# Altium footprint library ALL.PcbLib: 153 footprints (part 1 of 11)
Each footprint in its own frame and in the unit in brackets; x right, y up, seen from the top. Pads: shape width x height; smd on the part's side, far side on the other; paste and mask are expansions set on the pad; w line width, h text height; cw(c..) or ccw(c..) is an arc to the next point about the centre after c.
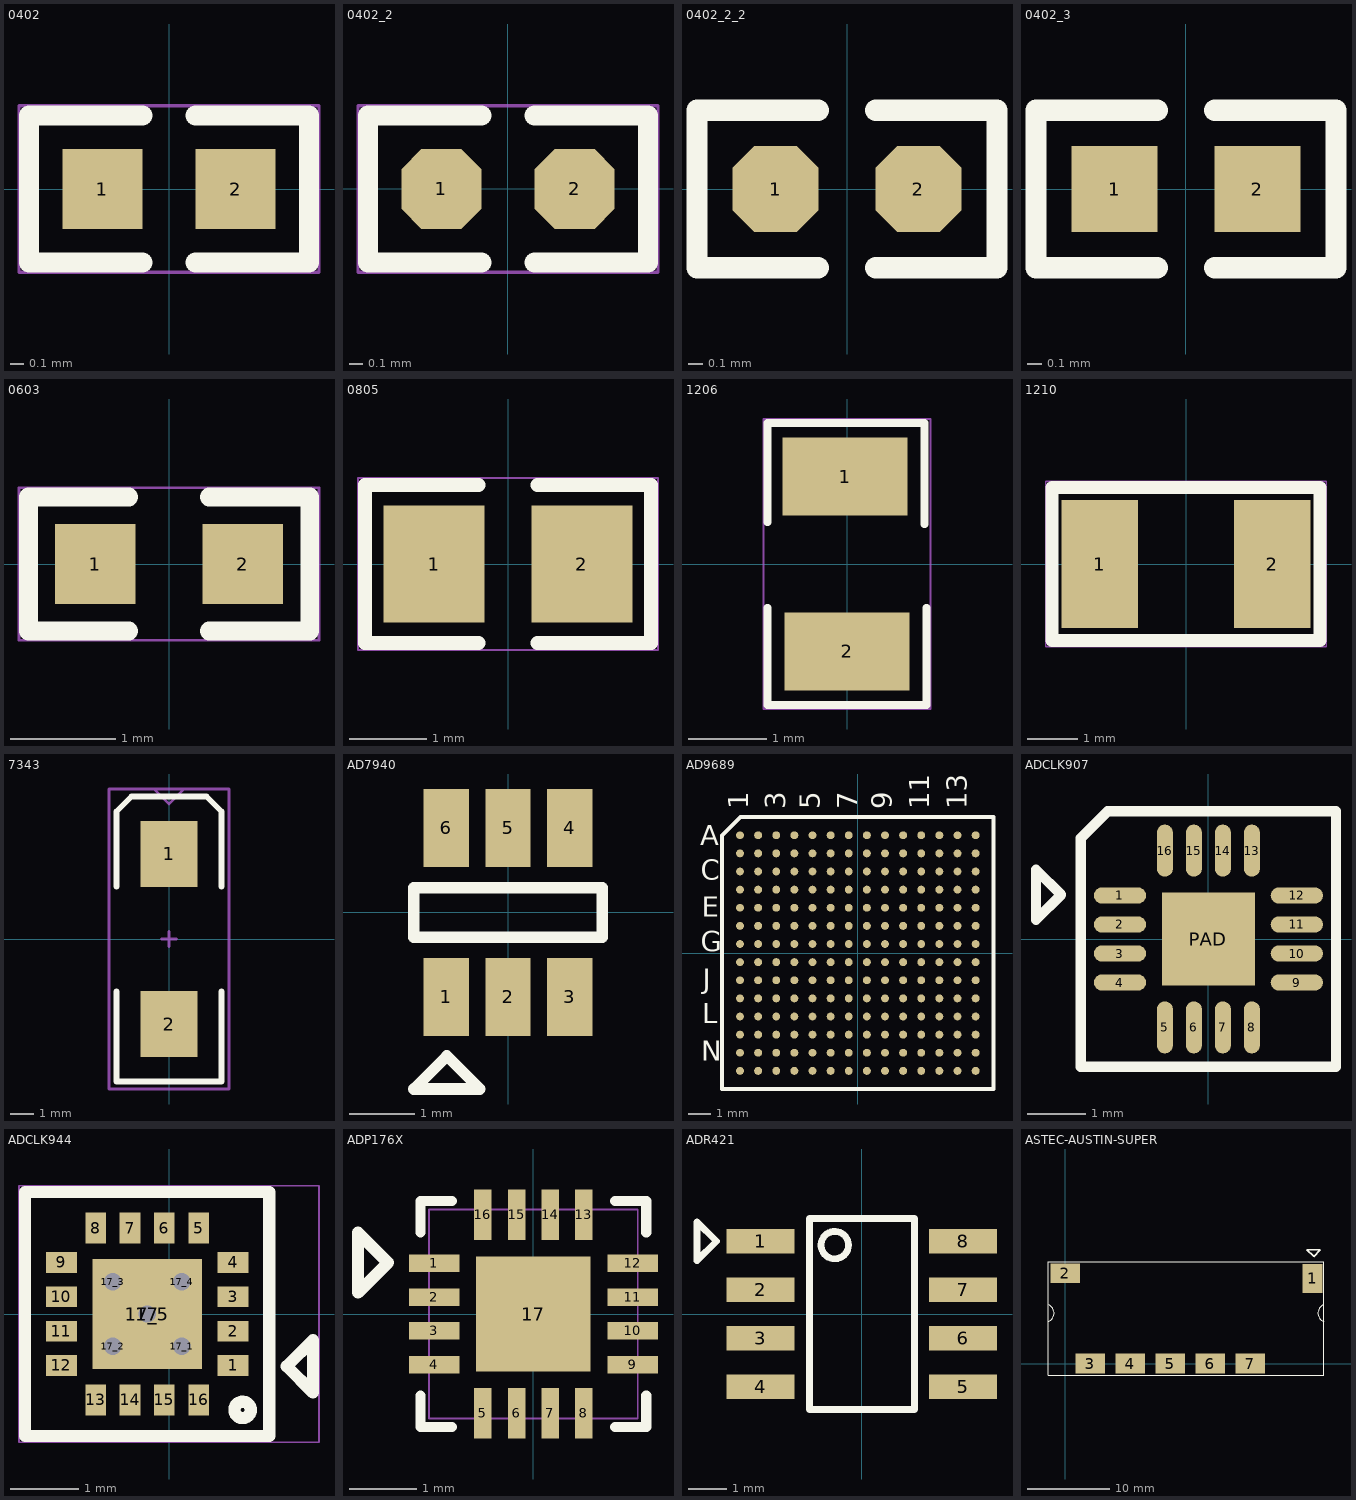
[diagram p0: the footprints below, top view; thin cyan lines are the x and y axes]

## 0402 [mm] "0402"
pads (2):
  rect 0.6x0.6 smd: 1(-0.5,0) 2(0.5,0)
Top Overlay:
  lines w0.15: -0.2,-0.55 -1.05,-0.55 -1.05,0.55 -0.2,0.55 ; 0.2,-0.55 1.05,-0.55 1.05,0.55 0.2,0.55
  text ".Designator" at 1.143,-1.016 h0.76
Mechanical 7:
  lines w0.025: -1.125,-0.625 1.125,-0.625 1.125,0.625 -1.125,0.625 -1.125,-0.625

## 0402_2 [mm] "0402_2"
pads (2):
  oct 0.6x0.6 smd: 1(-0.5,0) 2(0.5,0)
Top Overlay:
  lines w0.15: -0.2,-0.55 -1.05,-0.55 -1.05,0.55 -0.2,0.55 ; 0.2,-0.55 1.05,-0.55 1.05,0.55 0.2,0.55
Mechanical 7:
  lines w0.025: -1.125,-0.625 -1.125,0.625 1.125,0.625 1.125,-0.625 -1.125,-0.625
Mechanical 16:
  text ".Designator" at 0,0 h0.76

## 0402_2_2 [mm]
pads (2):
  oct 0.6x0.6 smd: 1(-0.5,0) 2(0.5,0)
Top Overlay:
  lines w0.15: -0.2,-0.55 -1.05,-0.55 -1.05,0.55 -0.2,0.55 ; 0.2,-0.55 1.05,-0.55 1.05,0.55 0.2,0.55

## 0402_3 [mm]
pads (2):
  rect 0.6x0.6 smd: 1(-0.5,0) 2(0.5,0)
Top Overlay:
  lines w0.15: -0.2,-0.55 -1.05,-0.55 -1.05,0.55 -0.2,0.55 ; 0.2,-0.55 1.05,-0.55 1.05,0.55 0.2,0.55

## 0603 [mil] "0603"
pads (2):
  rect 30x30 smd: 1(-27.5,0) 2(27.5,0)
Top Overlay:
  lines w7: -15,-25 -52.5,-25 -52.5,25 -15,25 ; 15,-25 52.5,-25 52.5,25 15,25
Mechanical 7:
  lines w1: -56,-28.5 -56,28.5 56,28.5 56,-28.5 -56,-28.5
Mechanical 16:
  text ".Designator" at 0,0 h30

## 0805 [mm] "0805"
pads (2):
  rect 1.3x1.5 smd: 1(-0.95,0) 2(0.95,0)
Top Overlay:
  lines w0.178: -0.381,-1.019 -1.841,-1.019 -1.841,1.019 -0.381,1.019 ; 0.381,-1.019 1.841,-1.019 1.841,1.019 0.381,1.019
  text ".Designator" at -3.683,-1.537 h0.76
Mechanical 7:
  lines w0.025: -1.93,-1.107 -1.93,1.107 1.93,1.107 1.93,-1.107 -1.93,-1.107

## 1206 [mil] "1206"
pads (2):
  rect 62.99x39.37 smd: 1(-1,44) 2(0,-44)
Top Overlay:
  lines w3.94: -40,-22 -40,-71 40,-71 40,-22 ; -40,21 -40,71 39,71 39,20
  text ".Designator" at 17,100 h30
Mechanical 7:
  lines w1: -41.97,-72.97 41.97,-72.97 41.97,72.97 -41.97,72.97 -41.97,-72.97

## 1210 [mil] "1210"
pads (2):
  rect 60x100 smd: 1(-67.5,0) 2(67.5,0)
Top Overlay:
  lines w10: -105,-60 -105,60 105,60 105,-60 -105,-60
  text ".Designator" at 10,158 h30
Mechanical 7:
  lines w1: -110,-65 110,-65 110,65 -110,65 -110,-65

## 7343 [mil]
pads (2):
  rect 95x110 smd: 1(0,142) 2(0,-142)
Top Overlay:
  lines w10: -87.5,-87.5 -87.5,-237.5 87.5,-237.5 87.5,-87.5 ; -87.5,87.5 -87.5,212.5 -62.5,237.5 62.5,237.5 87.5,212.5 87.5,87.5
Mechanical 8:
  lines w5: -25,250 0,225 25,250 ; -12.5,0 12.5,0 ; 0,-12.5 0,12.5 ; -100,-250 -100,250 100,250 100,-250 -100,-250

## AD7940 [mm]
pads (6):
  rect 0.7x1.2 smd: 1(-0.95,-1.3) 2(0,-1.3) 3(0.95,-1.3) 4(0.95,1.3) 5(0,1.3) 6(-0.95,1.3)
Top Overlay:
  lines w0.178: -1.45,-0.381 1.45,-0.381 1.45,0.381 -1.45,0.381 -1.45,-0.381 ; -1.448,-2.718 -0.94,-2.21 -0.432,-2.718 -1.448,-2.718

## AD9689 [mm]
pads (196):
  round 0.35 smd: A1(-5.2,5.2) A2(-4.4,5.2) A3(-3.6,5.2) A4(-2.8,5.2) A5(-2,5.2) A6(-1.2,5.2) A7(-0.4,5.2) A8(0.4,5.2) A9(1.2,5.2) A10(2,5.2) A11(2.8,5.2) A12(3.6,5.2) A13(4.4,5.2) A14(5.2,5.2) B1(-5.2,4.4) B2(-4.4,4.4) B3(-3.6,4.4) B4(-2.8,4.4) B5(-2,4.4) B6(-1.2,4.4) B7(-0.4,4.4) B8(0.4,4.4) B9(1.2,4.4) B10(2,4.4) B11(2.8,4.4) B12(3.6,4.4) B13(4.4,4.4) B14(5.2,4.4) C1(-5.2,3.6) C2(-4.4,3.6) C3(-3.6,3.6) C4(-2.8,3.6) C5(-2,3.6) C6(-1.2,3.6) C7(-0.4,3.6) C8(0.4,3.6) C9(1.2,3.6) C10(2,3.6) C11(2.8,3.6) C12(3.6,3.6) C13(4.4,3.6) C14(5.2,3.6) D1(-5.2,2.8) D2(-4.4,2.8) D3(-3.6,2.8) D4(-2.8,2.8) D5(-2,2.8) D6(-1.2,2.8) D7(-0.4,2.8) D8(0.4,2.8) D9(1.2,2.8) D10(2,2.8) D11(2.8,2.8) D12(3.6,2.8) D13(4.4,2.8) D14(5.2,2.8) E1(-5.2,2) E2(-4.4,2) E3(-3.6,2) E4(-2.8,2) E5(-2,2) E6(-1.2,2) E7(-0.4,2) E8(0.4,2) E9(1.2,2) E10(2,2) E11(2.8,2) E12(3.6,2) E13(4.4,2) E14(5.2,2) F1(-5.2,1.2) F2(-4.4,1.2) F3(-3.6,1.2) F4(-2.8,1.2) F5(-2,1.2) F6(-1.2,1.2) F7(-0.4,1.2) F8(0.4,1.2) F9(1.2,1.2) F10(2,1.2) F11(2.8,1.2) F12(3.6,1.2) F13(4.4,1.2) F14(5.2,1.2) G1(-5.2,0.4) G2(-4.4,0.4) G3(-3.6,0.4) G4(-2.8,0.4) G5(-2,0.4) G6(-1.2,0.4) G7(-0.4,0.4) G8(0.4,0.4) G9(1.2,0.4) G10(2,0.4) G11(2.8,0.4) G12(3.6,0.4) G13(4.4,0.4) G14(5.2,0.4) H1(-5.2,-0.4) H2(-4.4,-0.4) H3(-3.6,-0.4) H4(-2.8,-0.4) H5(-2,-0.4) H6(-1.2,-0.4) H7(-0.4,-0.4) H8(0.4,-0.4) H9(1.2,-0.4) H10(2,-0.4) H11(2.8,-0.4) H12(3.6,-0.4) H13(4.4,-0.4) H14(5.2,-0.4) J1(-5.2,-1.2) J2(-4.4,-1.2) J3(-3.6,-1.2) J4(-2.8,-1.2) J5(-2,-1.2) J6(-1.2,-1.2) J7(-0.4,-1.2) J8(0.4,-1.2) J9(1.2,-1.2) J10(2,-1.2) J11(2.8,-1.2) J12(3.6,-1.2) J13(4.4,-1.2) J14(5.2,-1.2) K1(-5.2,-2) K2(-4.4,-2) K3(-3.6,-2) K4(-2.8,-2) K5(-2,-2) K6(-1.2,-2) K7(-0.4,-2) K8(0.4,-2) K9(1.2,-2) K10(2,-2) K11(2.8,-2) K12(3.6,-2) K13(4.4,-2) K14(5.2,-2) L1(-5.2,-2.8) L2(-4.4,-2.8) L3(-3.6,-2.8) L4(-2.8,-2.8) L5(-2,-2.8) L6(-1.2,-2.8) L7(-0.4,-2.8) L8(0.4,-2.8) L9(1.2,-2.8) L10(2,-2.8) L11(2.8,-2.8) L12(3.6,-2.8) L13(4.4,-2.8) L14(5.2,-2.8) M1(-5.2,-3.6) M2(-4.4,-3.6) M3(-3.6,-3.6) M4(-2.8,-3.6) M5(-2,-3.6) M6(-1.2,-3.6) M7(-0.4,-3.6) M8(0.4,-3.6) M9(1.2,-3.6) M10(2,-3.6) M11(2.8,-3.6) M12(3.6,-3.6) M13(4.4,-3.6) M14(5.2,-3.6) N1(-5.2,-4.4) N2(-4.4,-4.4) N3(-3.6,-4.4) N4(-2.8,-4.4) N5(-2,-4.4) N6(-1.2,-4.4) N7(-0.4,-4.4) N8(0.4,-4.4) N9(1.2,-4.4) N10(2,-4.4) N11(2.8,-4.4) N12(3.6,-4.4) N13(4.4,-4.4) N14(5.2,-4.4) P1(-5.2,-5.2) P2(-4.4,-5.2) P3(-3.6,-5.2) P4(-2.8,-5.2) P5(-2,-5.2) P6(-1.2,-5.2) P7(-0.4,-5.2) P8(0.4,-5.2) P9(1.2,-5.2) P10(2,-5.2) P11(2.8,-5.2) P12(3.6,-5.2) P13(4.4,-5.2) P14(5.2,-5.2)
Top Overlay:
  lines w0.178: -6,-6 -6,5.182 -5.182,6 -5.156,6 6,6 6,-6 -6,-6
  text "1" at -4.846,6.353 h0.89
  text "J" at -6.837,-1.58 h0.89
  text "A" at -6.953,4.769 h0.89
  text "C" at -6.934,3.245 h0.89
  text "E" at -6.895,1.594 h0.89
  text "G" at -6.934,0.07 h0.89
  text "L" at -6.876,-3.105 h0.89
  text "N" at -6.915,-4.756 h0.89
  text "3" at -3.195,6.353 h0.89
  text "13" at 4.806,6.353 h0.89
  text "11" at 3.155,6.353 h0.89
  text "9" at 1.504,6.353 h0.89
  text "7" at -0.02,6.353 h0.89
  text "5" at -1.671,6.353 h0.89

## ADCLK907 [mm]
pads (17):
  oval 0.9x0.28 smd: 1(-1.524,0.75) 2(-1.524,0.25) 3(-1.524,-0.25) 4(-1.524,-0.75) 9(1.524,-0.75) 10(1.524,-0.25) 11(1.524,0.25) 12(1.524,0.75)
  oval 0.28x0.9 smd: 5(-0.75,-1.524) 6(-0.25,-1.524) 7(0.25,-1.524) 8(0.75,-1.524) 13(0.75,1.524) 14(0.25,1.524) 15(-0.25,1.524) 16(-0.75,1.524)
  rect 1.6x1.6 smd: PAD(0,0)
Top Overlay:
  lines w0.178: -2.972,0.33 -2.54,0.762 -2.972,1.194 -2.972,0.33 ; -2.2,-2.2 2.2,-2.2 2.2,2.2 -1.737,2.2 -2.159,1.778 -2.2,1.737 -2.2,-2.2

## ADCLK944 [mil] "ADCLK944"
pads (22):
  rect 17.72x11.81 smd: 1(36.71,-29.52) 2(36.71,-9.84) 3(36.71,9.85) 4(36.71,29.53) 9(-61.72,29.53) 10(-61.72,9.84) 11(-61.72,-9.84) 12(-61.71,-29.52)
  rect 11.81x17.72 smd: 5(17.03,49.22) 6(-2.66,49.22) 7(-22.34,49.22) 8(-42.03,49.22) 13(-42.03,-49.21) 14(-22.34,-49.21) 15(-2.66,-49.21) 16(17.03,-49.21)
  round 18 hole 10: 17(-12.5,0) 17_1(7.38,-18.47) 17_2(-32.38,-18.47) 17_3(-32.38,18.47) 17_4(7.38,18.48)
  rect 62.99x62.99 smd: 17_5(-12.5,0)
Top Overlay:
  circle w7: c42.22,-54.99 r4.72
  lines w7: -82.5,-69.99 57.5,-70 57.5,70 -82.51,70 -82.5,-69.99 ; 67.5,-30 82.5,-15 82.5,-44.99 67.5,-30
  text ".Designator" at 48.5,26 h30
Mechanical 7:
  lines w1: -86.01,-73.5 86,-73.5 86,73.5 -86.01,73.5 -86.01,-73.5

## ADP176X [mm]
pads (17):
  rect 0.75x0.26 smd paste+0: 1(-1.475,0.75) 2(-1.475,0.25) 3(-1.475,-0.25) 4(-1.475,-0.75) 9(1.475,-0.75) 10(1.475,-0.25) 11(1.475,0.25) 12(1.475,0.75)
  rect 0.26x0.75 smd paste+0: 5(-0.75,-1.475) 6(-0.25,-1.475) 7(0.25,-1.475) 8(0.75,-1.475) 13(0.75,1.475) 14(0.25,1.475) 15(-0.25,1.475) 16(-0.75,1.475)
  rect 1.7x1.7 smd: 17(0,0)
Top Overlay:
  lines w0.152: -1.677,-1.213 -1.677,-1.677 -1.213,-1.677 ; -1.677,1.213 -1.677,1.677 -1.213,1.677 ; 1.213,-1.677 1.677,-1.677 1.677,-1.213 ; 1.213,1.677 1.677,1.677 1.677,1.213
  lines w0.178: -2.603,0.318 -2.159,0.762 -2.603,1.206 -2.603,0.318
Mechanical 13:
  lines w0.025: -1.55,-1.55 1.55,-1.55 1.55,1.55 -1.55,1.55 -1.55,-1.55 ; -1.55,-0.9 -1.55,-0.6 -1.55,-0.9 ; -1.55,-0.4 -1.55,-0.1 -1.55,-0.4 ; -1.55,0.1 -1.55,0.4 -1.55,0.1 ; -1.55,0.6 -1.55,0.9 -1.55,0.6 ; -0.9,-1.55 -0.6,-1.55 -0.9,-1.55 ; -0.9,1.55 -0.6,1.55 -0.9,1.55 ; -0.4,-1.55 -0.1,-1.55 -0.4,-1.55 ; -0.4,1.55 -0.1,1.55 -0.4,1.55 ; 0.1,-1.55 0.4,-1.55 0.1,-1.55 ; 0.1,1.55 0.4,1.55 0.1,1.55 ; 0.6,-1.55 0.9,-1.55 0.6,-1.55 ; 0.6,1.55 0.9,1.55 0.6,1.55 ; 1.55,-0.9 1.55,-0.6 1.55,-0.9 ; 1.55,-0.4 1.55,-0.1 1.55,-0.4 ; 1.55,0.1 1.55,0.4 1.55,0.1 ; 1.55,0.6 1.55,0.9 1.55,0.6
  text "*" at -1.005,0.591 h0.89

## ADR421 [mm]
pads (8):
  rect 1.778x0.635 smd: 1(-2.65,1.905) 2(-2.65,0.635) 3(-2.65,-0.635) 4(-2.65,-1.905) 5(2.65,-1.905) 6(2.65,-0.635) 7(2.65,0.635) 8(2.65,1.905)
Top Overlay:
  circle w0.178: c-0.709,1.805 r0.359
  lines w0.178: -4.318,1.397 -3.81,1.905 -4.318,2.413 -4.318,1.397 ; -1.372,-2.5 -1.372,2.5 1.377,2.5 1.377,-2.5 -1.372,-2.5

## ASTEC-AUSTIN-SUPER [mil]
pads (7):
  rect 95x140 smd: 1(1177,405)
  rect 140x95 smd: 2(0,429.92) 3(120,0) 4(310,0) 5(500,0) 6(690,0) 7(880,0)
Top Overlay:
  lines w5: -80.02,280.01 cw(c-95.78,240) -79.95,200.02 ; 1229.95,200.02 cw(c1245.78,240) 1230.02,280.01 ; -80,-55 1230,-55 1230,485 -80,485 -80,-55
  lines w7: 1150,542 1182,510 1182.5,509.5 1215,542 1150,542